# Altium footprint library PcbLib.PcbLib: 72 footprints (part 3 of 5)
Each footprint in its own frame and in the unit in brackets; x right, y up, seen from the top. Pads: shape width x height; smd on the part's side, far side on the other; paste and mask are expansions set on the pad; w line width, h text height; cw(c..) or ccw(c..) is an arc to the next point about the centre after c.
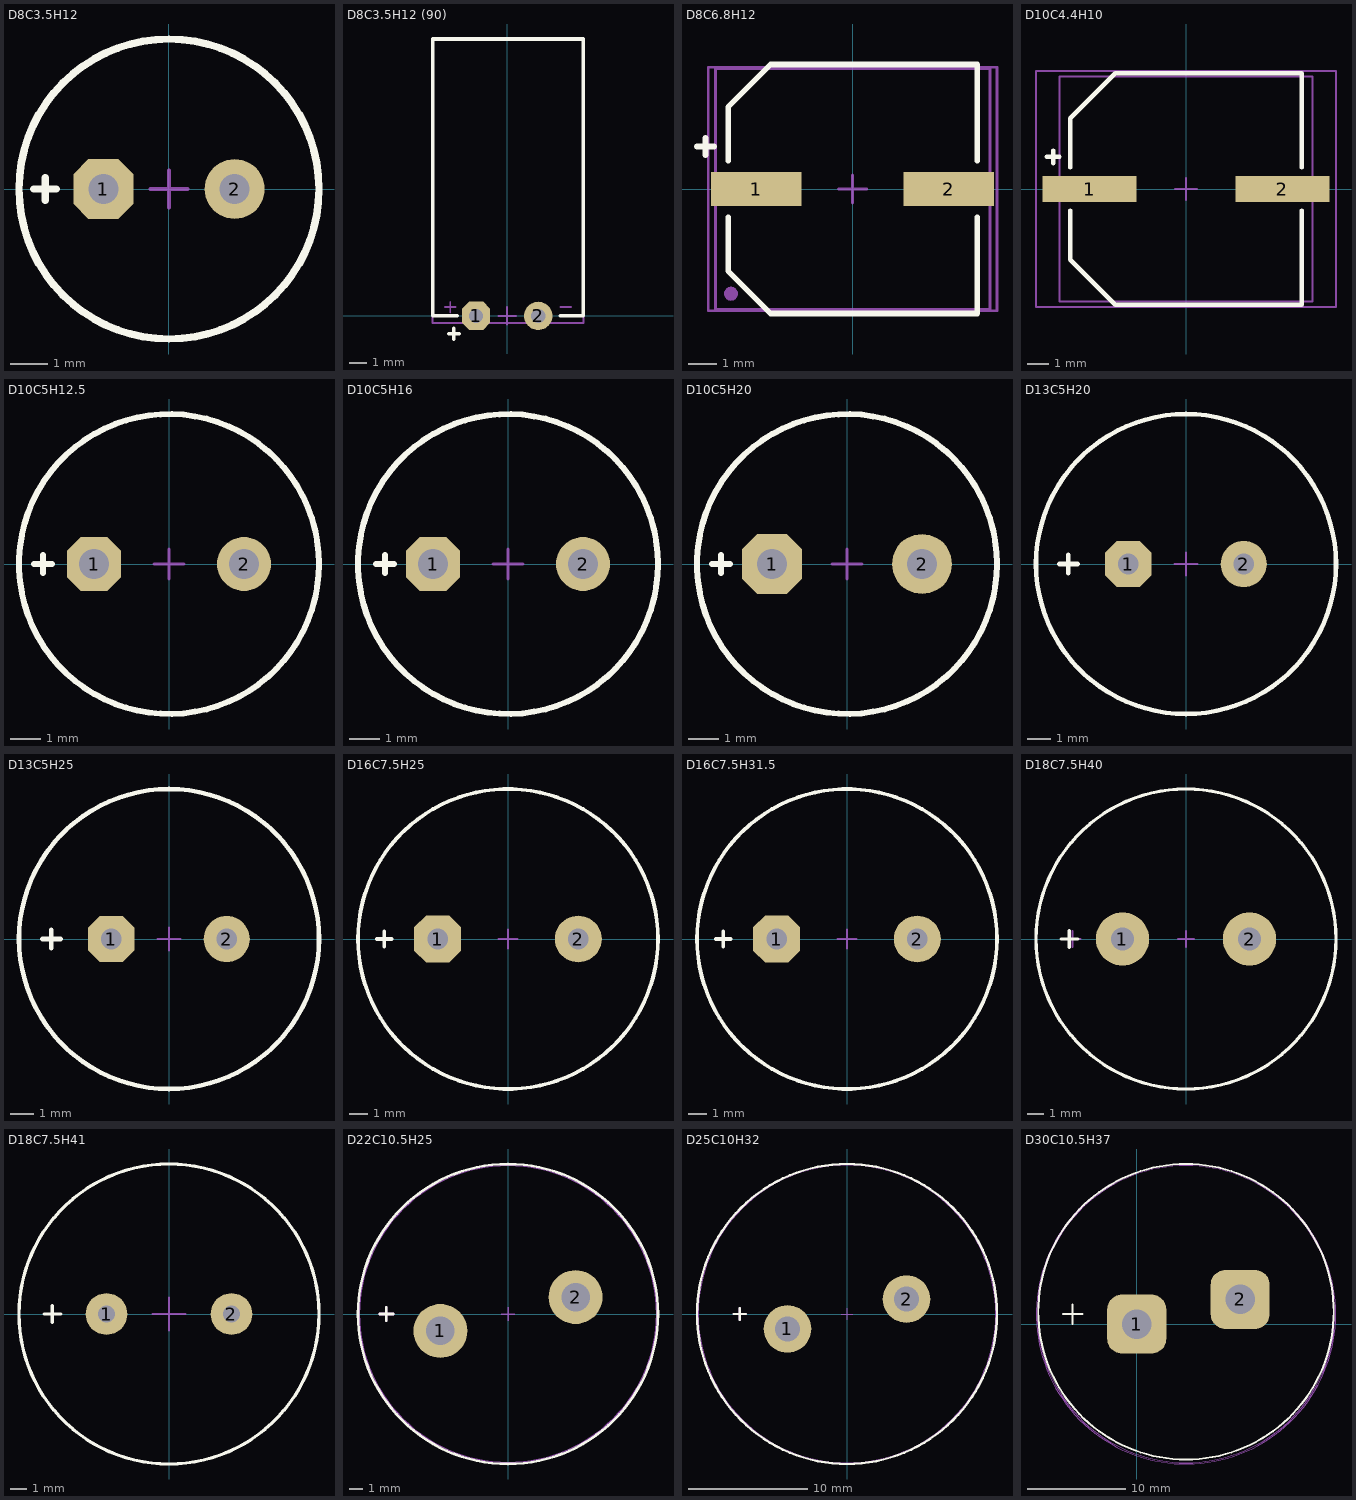
[diagram p2: the footprints below, top view; thin cyan lines are the x and y axes]

## D8C3.5H12 [mm] "Polar capacitor, diameter 8 mm, leads clearance 3.5 mm, height 12 mm"
height 12
pads (2):
  oct 1.6x1.6 hole 0.8: 1(-1.75,0)
  round 1.6 hole 0.8: 2(1.75,0)
Top Overlay:
  circle w0.2: c0,0 r4
  lines w0.2: -3.6,0 -3,0 ; -3.3,-0.3 -3.3,0.3
Top Assy:
  circle w0.1: c0,0 r4
Top Courtyard (Mech15):
  circle w0.1: c0,0 r4
  lines w0.1: -0.5,0 0.5,0 ; 0,-0.5 0,0.5
3D body "User Library-CapAluRadial_D80H115.STEP": height 13, standoff -3, extent -4.25,-4.247 4.25,4.247

## D8C3.5H12 (90) [mm] "Polar capacitor, diameter 8 mm, leads clearance 3.5 mm, height 12 mm"
height 12
pads (2):
  oct 1.6x1.6 hole 0.8: 1(-1.75,0)
  round 1.6 hole 0.8: 2(1.75,0)
Top Overlay:
  lines w0.2: -3.3,-1 -2.7,-1 ; -3,-1.3 -3,-0.7 ; -2.8,0 -4.2,0 -4.2,15.6 4.3,15.6 4.3,0 3,0
Top Assy:
  lines w0.1: -3.5,0.5 -2.9,0.5 ; -3.2,0.2 -3.2,0.8 ; 3,0.5 3.6,0.5 ; -4.2,-0.4 4.3,-0.4 4.3,15.6 -4.2,15.6 -4.2,-0.4
Top Courtyard (Mech15):
  lines w0.1: -0.5,0 0.5,0 ; 0,-0.5 0,0.5
3D body "User Library-CapAluRadial_D80H115.STEP": height 8.55, standoff 0.05, extent -4.2,-0.4 4.3,15.6

## D8C6.8H12 [mm]
height 10.3
pads (3):
  rect 3.2x1.2 smd: 1(-3.4,0) 2(3.4,0)
  round 0.5 on Mech13: ""(-4.3,-3.7)
Top Overlay:
  lines w0.2: -5.5,1.5 -4.9,1.5 ; -5.2,1.2 -5.2,1.8 ; -4.4,-1 -4.4,-2.9 -2.9,-4.4 4.4,-4.4 4.4,-1 ; -4.4,1 -4.4,2.9 -2.9,4.4 4.4,4.4 4.4,1
Top Assy:
  lines w0.1: -4.852,-4.25 4.848,-4.25 4.848,4.25 -4.852,4.25 -4.852,-4.25
Top Courtyard (Mech15):
  lines w0.1: -0.5,0 0.5,0 ; 0,-0.5 0,0.5 ; -5.1,-4.3 -5.1,4.3 5.1,4.3 5.1,-4.3 -5.1,-4.3
3D body "User Library-AL_EL_cap_8mmx10mm.STEP": height 10.5, standoff 0, extent -4.852,-4.25 4.848,4.25

## D10C4.4H10 [mm]
height 10.3
pads (2):
  rect 4.4x1.2 smd: 1(-4.5,0) 2(4.5,0)
Top Overlay:
  lines w0.2: -6.5,1.5 -5.9,1.5 ; -6.2,1.2 -6.2,1.8 ; -5.4,-1 -5.4,-3.2 -5.4,-3.3 -3.3,-5.4 5.4,-5.4 5.4,-1 ; -5.4,1 -5.4,3.2 -5.4,3.3 -3.3,5.4 5.4,5.4 5.4,1
Top Assy:
  lines w0.1: -5,0 -4,0 ; -4.5,-0.5 -4.5,0.5 ; -5.901,-5.25 5.899,-5.25 5.899,5.25 -5.901,5.25 -5.901,-5.25
Top Courtyard (Mech15):
  lines w0.1: -0.5,0 0.5,0 ; 0,-0.5 0,0.5 ; -7,-5.5 6.5,-5.5 7,-5.5 7,5.5 -7,5.5 -7,-5.5
3D body "User Library-cap_10x10x10-1.STEP": height 10.5, standoff 0, extent -5.901,-5.25 5.899,5.25

## D10C5H12.5 [mm] "Polar capacitor, diameter 10 mm, leads clearance 5 mm, height 12.5 mm"
height 12.5
pads (2):
  oct 1.8x1.8 hole 1: 1(-2.5,0)
  round 1.8 hole 1: 2(2.5,0)
Top Overlay:
  circle w0.2: c0,0 r5
  lines w0.2: -4.5,0 -3.9,0 ; -4.2,-0.3 -4.2,0.3
Top Assy:
  circle w0.1: c0,0 r5
Top Courtyard (Mech15):
  circle w0.1: c0,0 r5
  lines w0.1: -0.5,0 0.5,0 ; 0,-0.5 0,0.5
3D body "User Library-CapAluRadial_D100H125.STEP": height 14, standoff -3, extent -5.25,-5.249 5.25,5.249

## D10C5H16 [mm] "Polar capacitor, diameter 10 mm, leads clearance 5 mm, height 16 mm"
height 16
pads (2):
  oct 1.8x1.8 hole 1: 1(-2.5,0)
  round 1.8 hole 1: 2(2.5,0)
Top Overlay:
  circle w0.2: c0,0 r5
  lines w0.2: -4.4,0 -3.8,0 ; -4.1,-0.3 -4.1,0.3
Top Assy:
  circle w0.1: c0,0 r5
Top Courtyard (Mech15):
  circle w0.1: c0,0 r5
  lines w0.1: -0.5,0 0.5,0 ; 0,-0.5 0,0.5
3D body "User Library-CapAluRadial_D100H160.STEP": height 17.5, standoff -3, extent -5.25,-5.249 5.25,5.249

## D10C5H20 [mm] "Polar capacitor, diameter 10 mm, leads clearance 5 mm, height 20 mm"
height 20
pads (2):
  oct 2x2 hole 1: 1(-2.5,0)
  round 2 hole 1: 2(2.5,0)
Top Overlay:
  circle w0.2: c0,0 r5
  lines w0.2: -4.5,0 -3.9,0 ; -4.2,-0.3 -4.2,0.3
Top Assy:
  circle w0.1: c0,0 r5
Top Courtyard (Mech15):
  circle w0.1: c0,0 r5
  lines w0.1: -0.5,0 0.5,0 ; 0,-0.5 0,0.5
3D body "User Library-CapAluRadial_D100H200.STEP": height 22, standoff -3, extent -5.25,-5.249 5.25,5.249

## D13C5H20 [mm] "Polar capacitor, diameter 13 mm, leads clearance 5 mm, height 20 mm"
height 20
pads (2):
  oct 2x2 hole 0.9: 1(-2.5,0)
  round 2 hole 0.9: 2(2.5,0)
Top Overlay:
  circle w0.2: c0,0 r6.5
  lines w0.2: -5.5,0 -4.7,0 ; -5.1,-0.4 -5.1,0.4
Top Assy:
  circle w0.1: c0,0 r6.5
Top Courtyard (Mech15):
  circle w0.1: c0,0 r6.5
  lines w0.1: -0.5,0 0.5,0 ; 0,-0.5 0,0.5
3D body "User Library-Cap-EL(13x25-5).STEP": height 25, standoff -3.3, extent -6.5,-6.499 6.502,6.499

## D13C5H25 [mm] "Polar capacitor, diameter 13 mm, leads clearance 5 mm, height 25 mm"
height 25
pads (2):
  oct 2x2 hole 0.9: 1(-2.5,0)
  round 2 hole 0.9: 2(2.5,0)
Top Overlay:
  circle w0.2: c0,0 r6.5
  lines w0.2: -5.5,0 -4.7,0 ; -5.1,-0.4 -5.1,0.4
Top Assy:
  circle w0.1: c0,0 r6.5
Top Courtyard (Mech15):
  circle w0.1: c0,0 r6.5
  lines w0.1: -0.5,0 0.5,0 ; 0,-0.5 0,0.5
3D body "User Library-Cap-EL(13x25-5).STEP": height 25, standoff -3.3, extent -6.5,-6.499 6.502,6.499

## D16C7.5H25 [mm] "Polar capacitor, diameter 16 mm, leads clearance 7.5 mm, height 25 mm"
height 25
pads (2):
  oct 2.5x2.5 hole 1.1: 1(-3.75,0)
  round 2.5 hole 1.1: 2(3.75,0)
Top Overlay:
  circle w0.2: c0,0 r8
  lines w0.2: -7,0 -6.2,0 ; -6.6,-0.4 -6.6,0.4
Top Assy:
  circle w0.1: c0,0 r8
Top Courtyard (Mech15):
  circle w0.1: c0,0 r8
  lines w0.1: -0.5,0 0.5,0 ; 0,-0.5 0,0.5
3D body "User Library-CapAluRadial_D160H250.STEP": height 27, standoff -3, extent -8.25,-8.249 8.25,8.249

## D16C7.5H31.5 [mm] "Polar capacitor, diameter 16 mm, leads clearance 7.5 mm, height 31.5 mm"
height 31.5
pads (2):
  oct 2.5x2.5 hole 1.1: 1(-3.75,0)
  round 2.5 hole 1.1: 2(3.75,0)
Top Overlay:
  circle w0.2: c0,0 r8
  lines w0.2: -7,0 -6.2,0 ; -6.6,-0.4 -6.6,0.4
Top Assy:
  circle w0.1: c0,0 r8
Top Courtyard (Mech15):
  circle w0.1: c0,0 r8
  lines w0.1: -0.5,0 0.5,0 ; 0,-0.5 0,0.5
3D body "User Library-CapAluRadial_D160H315.STEP": height 33.5, standoff -3, extent -8.25,-8.25 8.25,8.249

## D18C7.5H40 [mm]
height 40
pads (2):
  round 3.2 hole 1.4: 1(-3.81,0) 2(3.81,0)
Top Overlay:
  circle w0.2: c0,0 r9
  lines w0.2: -7.5,0 -6.5,0 ; -7,-0.5 -7,0.5
Top Assy:
  circle w0.1: c0,0 r9
  lines w0.1: -7.31,0 -6.31,0 ; -6.81,-0.5 -6.81,0.5
Top Courtyard (Mech15):
  circle w0.1: c0,0 r9
  lines w0.1: -0.5,0 0.5,0 ; 0,-0.5 0,0.5
3D body "User Library-Cap-EL(18x40-7_5)T.STEP": height 41, standoff -3, extent -9,-8.999 9.002,9

## D18C7.5H41 [mm] "Polar capacitor, diameter 16 mm, leads clearance 7.5 mm, height 31.5 mm"
height 31.5
pads (2):
  round 2.5 hole 1: 1(-3.75,0) 2(3.75,0)
Top Overlay:
  circle w0.2: c0,0 r9
  lines w0.2: -7.5,0 -6.5,0 ; -7,-0.5 -7,0.5
Top Assy:
  circle w0.1: c0,0 r9
Top Courtyard (Mech15):
  circle w0.1: c0,0 r9
  lines w0.1: -1,0 1,0 ; 0,-1 0,1
3D body "Cap electrolitic radial 18x41.STEP": height 41.3, standoff -1.2, extent -8.997,-8.999 8.997,9

## D22C10.5H25 [mm]
height 25
pads (2):
  round 4 hole 2.1: 1(-5,-1.25) 2(5,1.25)
Top Overlay:
  circle w0.2: c0,0 r11.1
  lines w0.2: -9.5,0 -8.5,0 ; -9,-0.5 -9,0.5
Top Assy:
  circle w0.1: c0,0 r11
  lines w0.2: -9.5,0 -8.5,0 ; -9,-0.5 -9,0.5
Top Courtyard (Mech15):
  circle w0.1: c0,0 r11
  lines w0.1: -0.5,0 0.5,0 ; 0,-0.5 0,0.5
3D body "User Library-ECEC2DP271BJ.STEP": height 25, standoff 0, extent -11,-11 11,11

## D25C10H32 [mm]
height 25
pads (2):
  round 4 hole 2.1: 1(-5,-1.25) 2(5,1.25)
Top Overlay:
  circle w0.2: c0,0 r12.6
  lines w0.2: -9.5,0 -8.5,0 ; -9,-0.5 -9,0.5
Top Assy:
  circle w0.1: c0,0 r12.5
  lines w0.2: -9.5,0 -8.5,0 ; -9,-0.5 -9,0.5
Top Courtyard (Mech15):
  circle w0.1: c0,0 r12.5
  lines w0.1: -0.5,0 0.5,0 ; 0,-0.5 0,0.5
3D body "D25H32.STEP": height 37.87, standoff 0.06, extent -13,-13 13,12.991

## D30C10.5H37 [mm]
height 37
pads (2):
  rrect50% 6x6 hole 3: 1(0,0) 2(10.5,2.5)
Top Overlay:
  circle w0.2: c5,1.25 r15
  lines w0.2: -7.5,1 -5.5,1 ; -6.5,0 -6.5,2
Top Assy:
  circle w0.1: c5,1 r15.207
  lines w0.1: -7.5,1 -5.5,1 ; -6.5,0 -6.5,2
Top Courtyard (Mech15):
  circle w0.1: c5,1 r15.075
3D body "User Library-Assy_CE_R400_D1200_H1450.STEP": height 36.83, standoff -6.89, extent -12.7,-16.473 22.61,18.836